# Altium footprint library Amirreza.PcbLib: 524 footprints (part 22 of 33)
Each footprint in its own frame and in the unit in brackets; x right, y up, seen from the top. Pads: shape width x height; smd on the part's side, far side on the other; paste and mask are expansions set on the pad; w line width, h text height; cw(c..) or ccw(c..) is an arc to the next point about the centre after c.
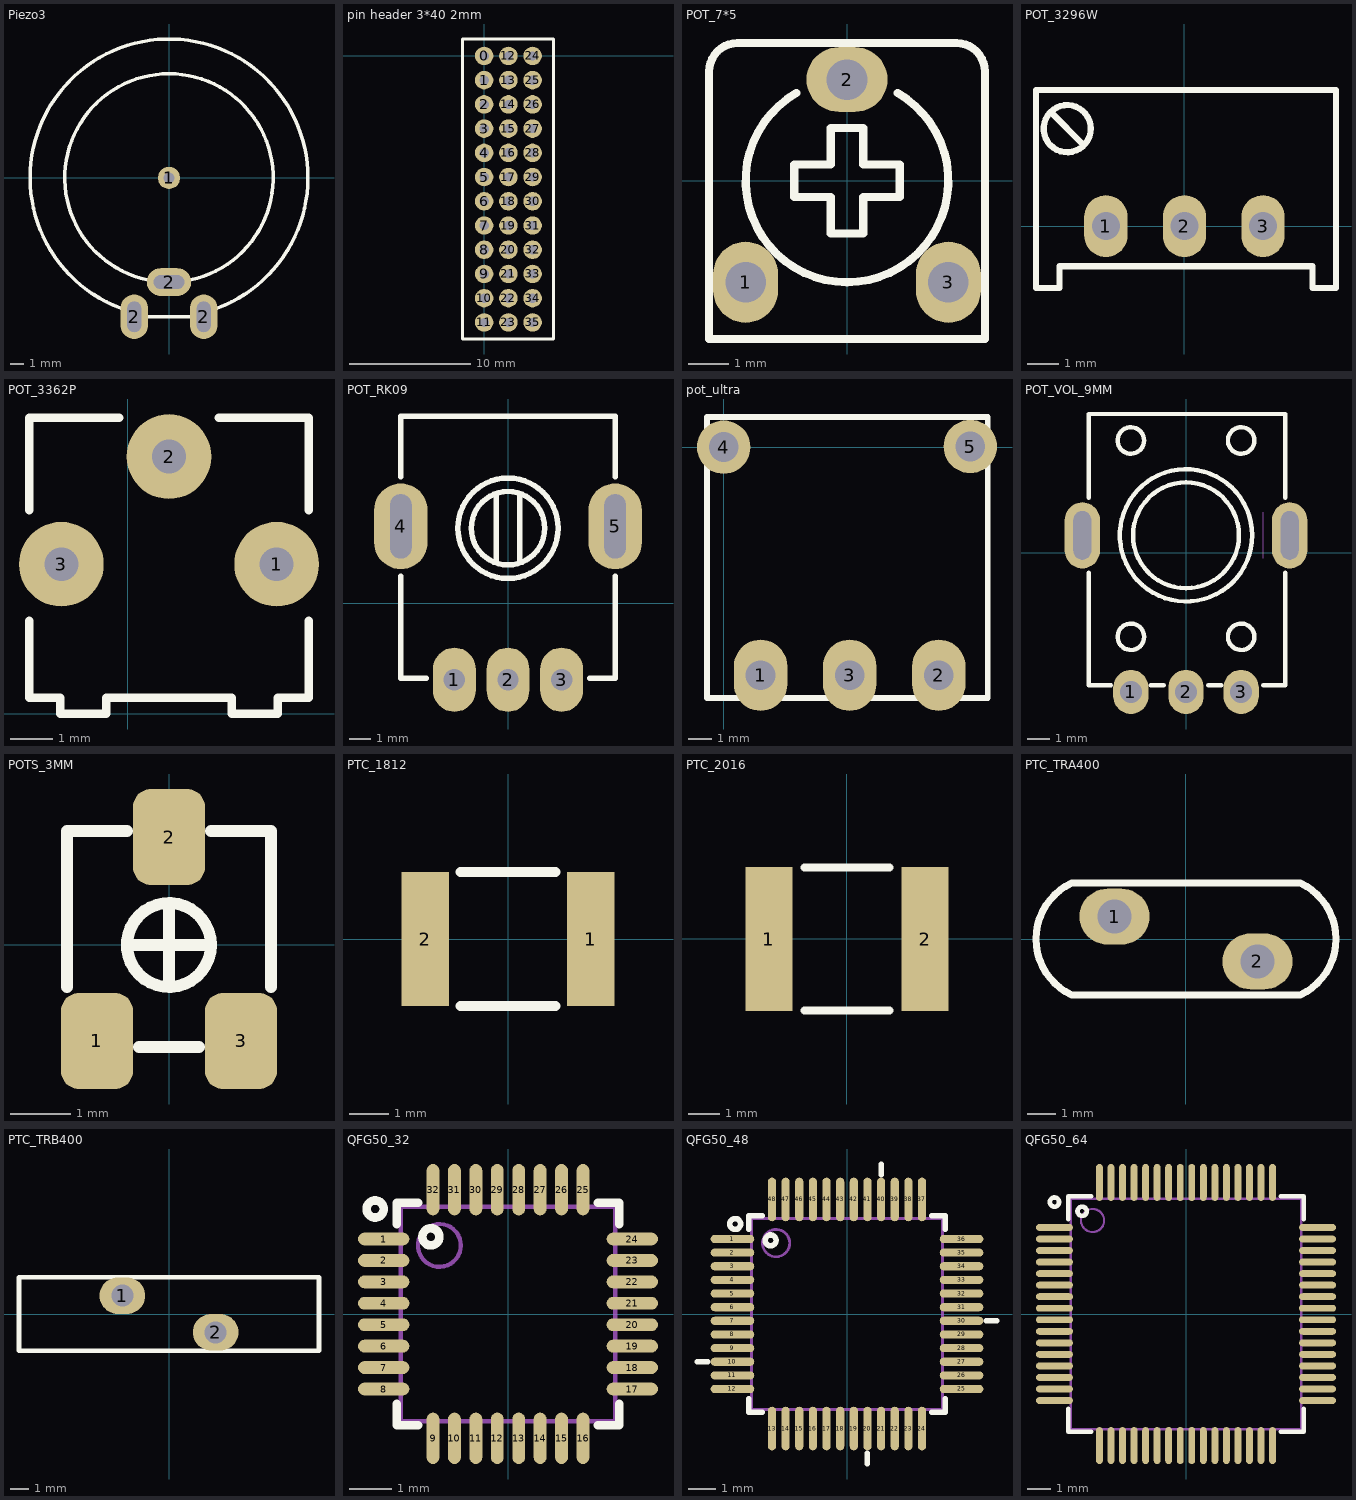
[diagram p21: the footprints below, top view; thin cyan lines are the x and y axes]

## Piezo3 [mm]
pads (4):
  round 1.6 hole 0.8: 1(0,0)
  oval 2x3.2 hole 2.2 slot 1 at 0 deg: 2(-2.5,-10) 2(2.5,-10)
  oval 3.2x2 hole 2.2 slot 1 at 90 deg: 2(0,-7.5)
Top Overlay:
  lines w0.254: -3.489,-9.371 cw(c0,0) 3.489,-9.371 ; -1.577,-7.332 cw(c0,0) 1.565,-7.335 ; -1.5,-10 1.5,-10

## pin header 3*40 2mm [mil]
pads (36):
  round 60 hole 30: 0(0,0) 1(0,-78.74) 2(0,-157.48) 3(0,-236.22) 4(0,-314.96) 5(0,-393.7) 6(0,-472.44) 7(0,-551.18) 8(0,-629.92) 9(0,-708.66) 10(0,-787.4) 11(0,-866.14) 12(78.74,0) 13(78.74,-78.74) 14(78.74,-157.48) 15(78.74,-236.22) 16(78.74,-314.96) 17(78.74,-393.7) 18(78.74,-472.44) 19(78.74,-551.18) 20(78.74,-629.92) 21(78.74,-708.66) 22(78.74,-787.4) 23(78.74,-866.14) 24(157.48,0) 25(157.48,-78.74) 26(157.48,-157.48) 27(157.48,-236.22) 28(157.48,-314.96) 29(157.48,-393.7) 30(157.48,-472.44) 31(157.48,-551.18) 32(157.48,-629.92) 33(157.48,-708.66) 34(157.48,-787.4) 35(157.48,-866.14)
Top Overlay:
  lines w10: -70,-920 -70,55 225,55 225,-920 -70,-920

## POT_7*5 [mm] "POT, TRIM, 7.5X5.0mm, pitch: 5.0mm"
pads (3):
  oval 1.6x2 hole 1: 1(-2.5,-2.5) 3(2.5,-2.5)
  oval 2x1.6 hole 1: 2(0,2.5)
Top Overlay:
  lines w0.2: -1.25,2.165 ccw(c0,0) 1.25,2.165 ; -3.4,-3.9 -3.4,2.7 cw(c-2.7,2.7) -2.7,3.4 2.7,3.4 cw(c2.7,2.7) 3.4,2.7 3.4,-3.9 -3.4,-3.9 ; -1.3,-0.4 -1.3,0.4 -0.4,0.4 -0.4,1.3 0.4,1.3 0.4,0.4 1.3,0.4 1.3,-0.4 0.4,-0.4 0.4,-1.3 -0.4,-1.3 -0.4,-0.4 -1.3,-0.4
3D body "User Library-Pot - RES_VAR1.STEP": height 7, standoff -3.9, extent -3.25,-3.775 3.25,3.275

## POT_3296W [mm] "POT, TRIM, 10.0X5.0mm, pitch: 2.5mm 3299W 3296W S64W"
pads (3):
  oval 1.4x2 / inner round 1.2 / far side oval 1.4x2 hole 0.9: 1(-2.54,0) 2(0,0) 3(2.54,0)
Top Overlay:
  circle w0.2: c-3.791,3.151 r0.762
  lines w0.2: -4.299,3.659 -3.283,2.643 ; -4.8,-2 -4.8,4.4 4.9,4.4 4.9,-2 4.145,-2 4.145,-1.3 -4.045,-1.3 -4.045,-2 -4.8,-2
3D body "pot 3299W-1-103RLF.step": height 11.56, standoff -6.22, extent -4.725,-1.848 4.8,4.248

## POT_3362P [mm]
pads (3):
  round 2 hole 0.8: 1(3.511,3.53) 2(0.971,6.07) 3(-1.569,3.53)
Top Overlay:
  lines w0.203: -2.329,2.189 -2.329,0.382 -1.592,0.382 -1.592,0 -0.508,0 -0.508,0.382 ; -2.329,4.801 -2.329,6.99 -0.202,6.99 ; 2.145,6.99 4.271,6.99 4.271,4.801 ; 4.271,2.189 4.271,0.382 3.535,0.382 3.535,0 2.45,0 2.45,0.382 -0.508,0.382 ; -0.508,0.382 -0.508,0.382
3D body "User Library-R_3362P.step": height 4.75, standoff -2.75, extent -2.328,-0.01 4.272,6.98

## POT_RK09 [mm]
pads (5):
  oval 2x3 hole 1: 1(-2.5,-3.58) 2(0,-3.58) 3(2.5,-3.58)
  oval 2.5x4 hole 1 slot 3 at 90 deg: 4(-5,3.58) 5(5,3.58)
Top Overlay:
  circle w0.254: c0,3.491 r1.714
  circle w0.254: c0,3.491 r2.341
  lines w0.254: -5,1.256 -5,-3.52 -3.82,-3.52 ; -5,5.893 -5,8.722 5,8.722 5,5.893 ; -0.54,1.941 -0.54,5.066 ; 0.54,1.967 0.54,5.091 ; 3.82,-3.52 5,-3.52 5,1.256
3D body "RK09K1130AH1.STEP": height 25.05, standoff -3.75, extent -5.7,-3.809 5.7,8.841

## pot_ultra [mil]
pads (5):
  oval 90x120 hole 50: 1(62,-384) 2(362,-384) 3(212,-384)
  round 90 hole 50: 4(0,0) 5(415,1)
Top Overlay:
  lines w10: -28,-422 -28,50.44 444.44,50.44 444.44,-422 -28,-422

## POT_VOL_9MM [mm] "VOULME  9mm Alpha Alps, RV09ACF EVUF"
height 0.508
pads (5):
  oval 1.6x2 / inner round 1.4 / far side oval 1.6x2 hole 1: 1(-2.5,-6.3) 2(0,-6.3) 3(2.5,-6.3)
  oval 1.6x3 hole 0.8 slot 2.2 at 90 deg: ""(-4.7,0.8) ""(4.7,0.8)
Top Overlay:
  circle w0.2: c-2.5,-3.8 r0.6
  circle w0.2: c2.5,-3.8 r0.6
  circle w0.2: c-2.5,5.1 r0.6
  circle w0.2: c2.5,5.1 r0.6
  circle w0.2: c0,0.8 r3
  circle w0.2: c0,0.8 r2.4
  lines w0.2: -4.4,-0.9 -4.4,-6 -3.4,-6 ; -4.4,2.5 -4.4,6.3 4.5,6.3 4.5,2.5 ; -1.6,-6 -1,-6 ; 1,-6 1.6,-6 ; 3.5,-6 4.5,-6 4.5,-0.9
Mechanical 1:
  lines w0.008: 3.5,-0.25 3.5,1.85
3D body "User Library-RV09ACF-40_RK09K1130A5R.step": height 20.1, standoff -3.7, extent -4.902,-6.428 4.849,6.122

## POTS_3MM [mm] "POT SMD, 3.0X3.0mm, Trimming PVG3A PVZ3A"
pads (3):
  rrect50% 1.2x1.6 smd: 1(-1.2,-1.6) 2(0,1.8) 3(1.2,-1.6)
Top Overlay:
  circle w0.2: c0,0 r0.7
  lines w0.2: -1.7,-0.7 -1.7,1.9 -0.7,1.9 ; -0.7,0 0.7,0 ; -0.5,-1.7 0.5,-1.7 ; 0,-0.7 0,0.7 ; 0.7,1.9 1.7,1.9 1.7,-0.7
3D body "User Library-PVZ3A.STEP": height 1.95, standoff 0, extent -1.55,-1.85 1.55,1.84

## PTC_1812 [mm]
pads (2):
  rect 1.2x3.4 smd: 1(2.1,0) 2(-2.1,0)
Top Overlay:
  lines w0.25: -1.2,-1.7 1.2,-1.7 ; -1.2,1.7 1.2,1.7
3D body "User Library-0ZCG-0_70mm.step": height 0.93, standoff 0.03, extent -2.25,-1.6 2.25,1.6

## PTC_2016 [mm]
pads (2):
  rect 1.5x4.6 smd: 1(-2.495,0) 2(2.496,0)
Top Overlay:
  lines w0.254: -1.364,-2.286 1.365,-2.286 ; -1.364,2.286 1.365,2.286
3D body "User Library-0ZCG-0_70mm.step": height 0.93, standoff 0.03, extent -2.25,-1.6 2.25,1.6

## PTC_TRA400 [mm]
pads (2):
  oval 2.5x2 hole 1.2: 1(-2.55,0.8) 2(2.55,-0.8)
Top Overlay:
  lines w0.254: -4.063,-2 cw(c-3.152,0) -4.063,2 4.063,2 cw(c3.152,0) 4.063,-2 -4.063,-2
3D body "MF-R110.SLDPRT": height 14.65, standoff -7.2, extent -4.45,-1.534 4.45,1.56

## PTC_TRB400 [mm]
pads (2):
  oval 2.5x2 hole 1.2: 1(-2.55,1) 2(2.55,-1)
Top Overlay:
  lines w0.254: -8.2,-2 -8.2,2 8.2,2 8.2,-2 -8.2,-2
3D body "User Library-TE_CONNECTIVITY_RUEF400.step": height 22.3, standoff -8, extent -7,-1.406 7,1.406

## QFG50_32 [mm] "PBS TSQFP, 32-Leads, Body 5.00x5.00mm, Pitch 0.50mm"
height 1
pads (32):
  oval 1.2x0.3 smd mask+0.05: 1(-2.9,1.75) 2(-2.9,1.25) 3(-2.9,0.75) 4(-2.9,0.25) 5(-2.9,-0.25) 6(-2.9,-0.75) 7(-2.9,-1.25) 8(-2.9,-1.75) 17(2.9,-1.75) 18(2.9,-1.25) 19(2.9,-0.75) 20(2.9,-0.25) 21(2.9,0.25) 22(2.9,0.75) 23(2.9,1.25) 24(2.9,1.75)
  oval 0.3x1.2 smd mask+0.05: 9(-1.75,-2.9) 10(-1.25,-2.9) 11(-0.75,-2.9) 12(-0.25,-2.9) 13(0.25,-2.9) 14(0.75,-2.9) 15(1.25,-2.9) 16(1.75,-2.9) 25(1.75,2.9) 26(1.25,2.9) 27(0.75,2.9) 28(0.25,2.9) 29(-0.25,2.9) 30(-0.75,2.9) 31(-1.25,2.9) 32(-1.75,2.9)
Top Overlay:
  circle w0.2: c-3.1,2.45 r0.2
  circle w0.2: c-1.8,1.8 r0.2
  lines w0.2: -2.6,-2.1 -2.6,-2.6 -2.1,-2.6 ; -2.6,2.1 -2.6,2.6 -2.1,2.6 ; 2.1,-2.6 2.6,-2.6 2.6,-2.1 ; 2.1,2.6 2.6,2.6 2.6,2.1
Mechanical 13:
  circle w0.1: c-1.6,1.6 r0.5
  lines w0.1: -2.5,-2.5 -2.5,2.5 2.5,2.5 2.5,-2.5 -2.5,-2.5
3D body "QFG50_32_.step": height 1, standoff 0, extent -3,-3 3,3

## QFG50_48 [mm] "LQFP48, PQFF, PQFG, TSQFP, 48-Leads, Body 7.00x7.00mm, Pitch 0.50mm"
height 1.6
pads (48):
  oval 1.6x0.3 smd mask+0.05: 1(-4.2,2.75) 2(-4.2,2.25) 3(-4.2,1.75) 4(-4.2,1.25) 5(-4.2,0.75) 6(-4.2,0.25) 7(-4.2,-0.25) 8(-4.2,-0.75) 9(-4.2,-1.25) 10(-4.2,-1.75) 11(-4.2,-2.25) 12(-4.2,-2.75) 25(4.2,-2.75) 26(4.2,-2.25) 27(4.2,-1.75) 28(4.2,-1.25) 29(4.2,-0.75) 30(4.2,-0.25) 31(4.2,0.25) 32(4.2,0.75) 33(4.2,1.25) 34(4.2,1.75) 35(4.2,2.25) 36(4.2,2.75)
  oval 0.3x1.6 smd mask+0.05: 13(-2.75,-4.2) 14(-2.25,-4.2) 15(-1.75,-4.2) 16(-1.25,-4.2) 17(-0.75,-4.2) 18(-0.25,-4.2) 19(0.25,-4.2) 20(0.75,-4.2) 21(1.25,-4.2) 22(1.75,-4.2) 23(2.25,-4.2) 24(2.75,-4.2) 37(2.75,4.2) 38(2.25,4.2) 39(1.75,4.2) 40(1.25,4.2) 41(0.75,4.2) 42(0.25,4.2) 43(-0.25,4.2) 44(-0.75,4.2) 45(-1.25,4.2) 46(-1.75,4.2) 47(-2.25,4.2) 48(-2.75,4.2)
Top Overlay:
  circle w0.2: c-2.8,2.7 r0.2
  circle w0.2: c-4.1,3.3 r0.2
  lines w0.2: -5.5,-1.75 -5.1,-1.75 ; -3.6,-3.1 -3.6,-3.6 -3.1,-3.6 ; -3.6,3.1 -3.6,3.6 -3.1,3.6 ; 0.75,-5.5 0.75,-5.1 ; 1.25,5.1 1.25,5.5 ; 3.1,-3.6 3.6,-3.6 3.6,-3.1 ; 3.1,3.6 3.6,3.6 3.6,3.1 ; 5.1,-0.25 5.5,-0.25
Mechanical 13:
  circle w0.1: c-2.6,2.6 r0.5
  lines w0.1: -3.5,-3.5 3.5,-3.5 3.5,3.5 -3.5,3.5 -3.5,-3.5
3D body "LQFP48_Grid_0_5.STEP": height 1.6, standoff 0, extent -4.5,-4.5 4.5,4.5

## QFG50_64 [mm] "A64 (CYPRESS), TQFP64, LQFP64, VQ44, VQG44, 10X10mm, Pitch: 0.5mm"
height 1.2
pads (64):
  oval 1.6x0.3 smd mask+0.05: 1(-5.7,3.75) 2(-5.7,3.25) 3(-5.7,2.75) 4(-5.7,2.25) 5(-5.7,1.75) 6(-5.7,1.25) 7(-5.7,0.75) 8(-5.7,0.25) 9(-5.7,-0.25) 10(-5.7,-0.75) 11(-5.7,-1.25) 12(-5.7,-1.75) 13(-5.7,-2.25) 14(-5.7,-2.75) 15(-5.7,-3.25) 16(-5.7,-3.75) 33(5.7,-3.75) 34(5.7,-3.25) 35(5.7,-2.75) 36(5.7,-2.25) 37(5.7,-1.75) 38(5.7,-1.25) 39(5.7,-0.75) 40(5.7,-0.25) 41(5.7,0.25) 42(5.7,0.75) 43(5.7,1.25) 44(5.7,1.75) 45(5.7,2.25) 46(5.7,2.75) 47(5.7,3.25) 48(5.7,3.75)
  oval 0.3x1.6 smd mask+0.05: 17(-3.75,-5.7) 18(-3.25,-5.7) 19(-2.75,-5.7) 20(-2.25,-5.7) 21(-1.75,-5.7) 22(-1.25,-5.7) 23(-0.75,-5.7) 24(-0.25,-5.7) 25(0.25,-5.7) 26(0.75,-5.7) 27(1.25,-5.7) 28(1.75,-5.7) 29(2.25,-5.7) 30(2.75,-5.7) 31(3.25,-5.7) 32(3.75,-5.7) 49(3.75,5.7) 50(3.25,5.7) 51(2.75,5.7) 52(2.25,5.7) 53(1.75,5.7) 54(1.25,5.7) 55(0.75,5.7) 56(0.25,5.7) 57(-0.25,5.7) 58(-0.75,5.7) 59(-1.25,5.7) 60(-1.75,5.7) 61(-2.25,5.7) 62(-2.75,5.7) 63(-3.25,5.7) 64(-3.75,5.7)
Top Overlay:
  circle w0.2: c-5.7,4.849 r0.2
  circle w0.2: c-4.5,4.449 r0.2
  lines w0.2: -5.1,-4.1 -5.1,-5.1 -4.1,-5.1 ; -5.1,4.1 -5.1,5.1 -4.1,5.1 ; 4.1,-5.1 5.1,-5.1 5.1,-4.1 ; 4.1,5.1 5.1,5.1 5.1,4.1
Mechanical 13:
  circle w0.1: c-4.05,4.05 r0.5
  lines w0.1: -5,-5 5,-5 5,5 -5,5 -5,-5
3D body "LQFP-64.step": height 1.6, standoff 0, extent -6,-6 6,6